# Altium footprint library Connectors.PcbLib: 87 footprints (part 1 of 6)
Each footprint in its own frame and in the unit in brackets; x right, y up, seen from the top. Pads: shape width x height; smd on the part's side, far side on the other; paste and mask are expansions set on the pad; w line width, h text height; cw(c..) or ccw(c..) is an arc to the next point about the centre after c.
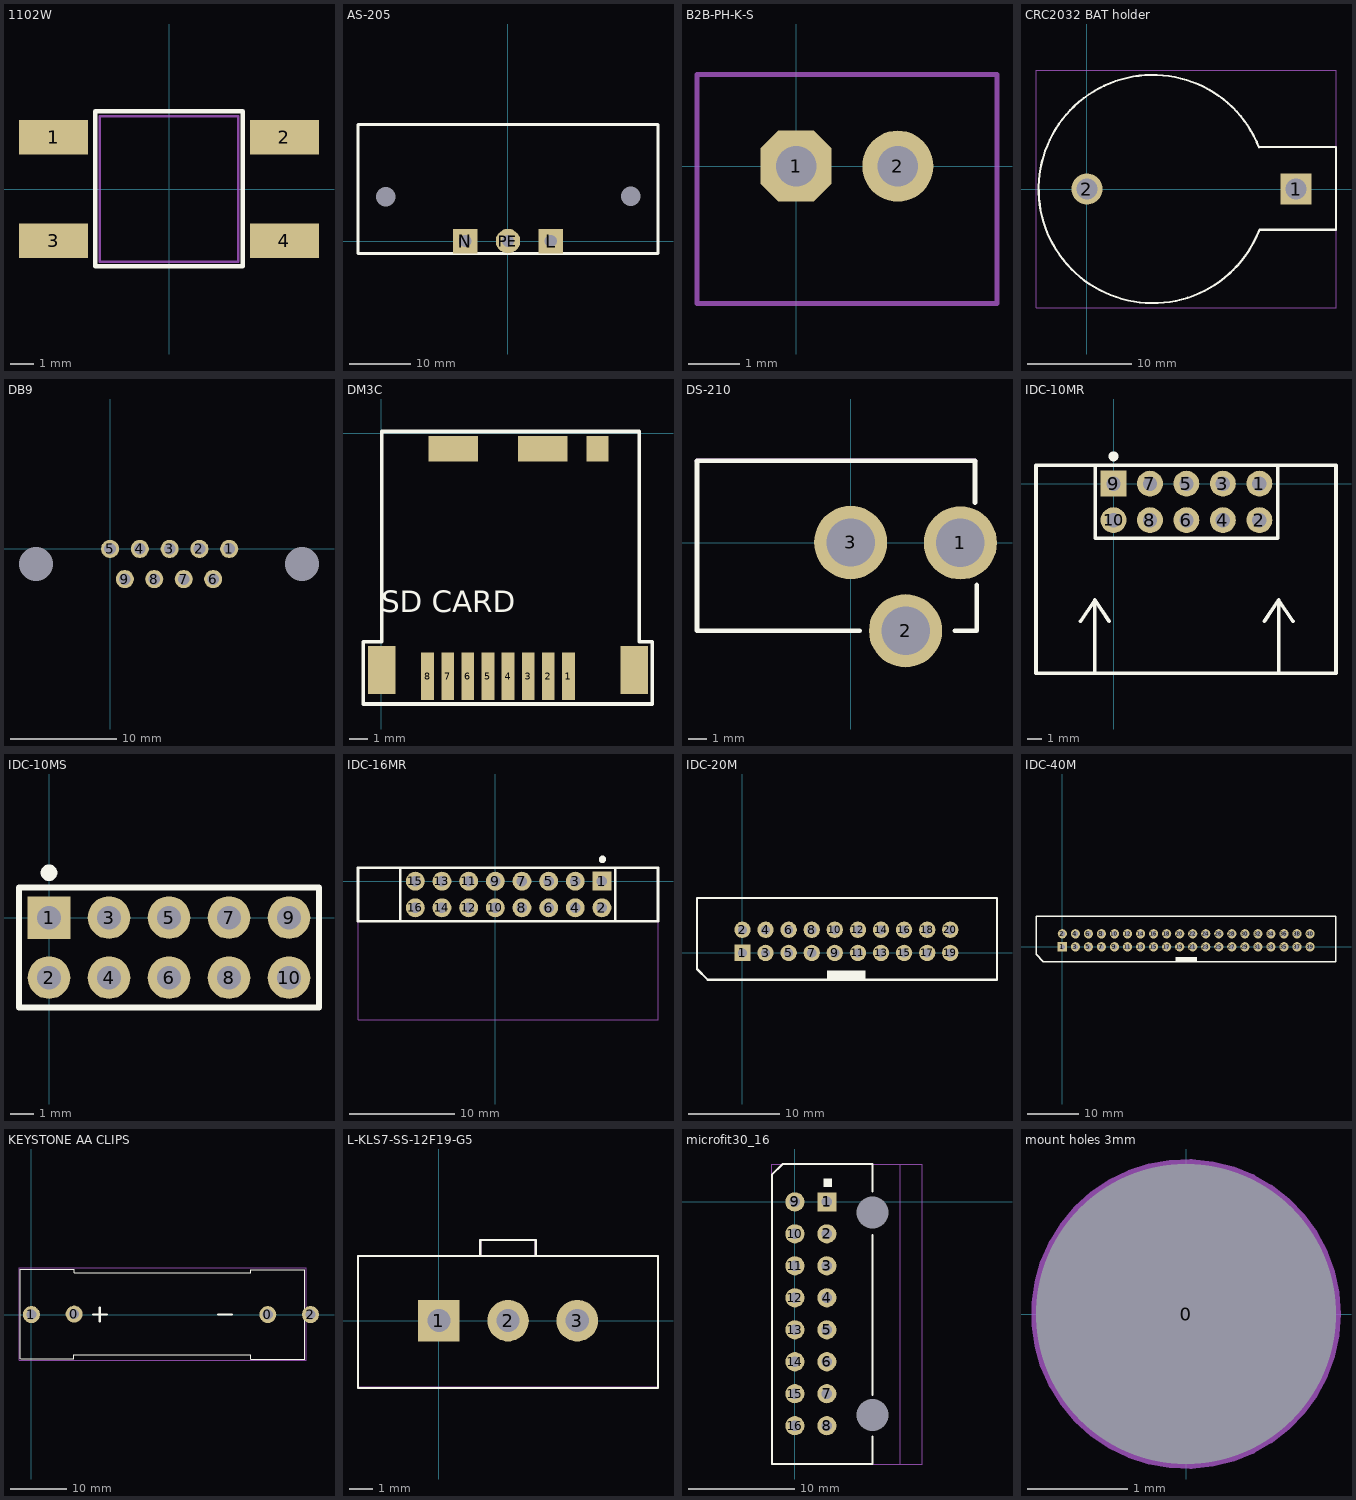
[diagram p0: the footprints below, top view; thin cyan lines are the x and y axes]

## 1102W [mm]
height 6
pads (4):
  rect 3x1.5 smd: 1(-5,2.25) 2(5,2.25) 3(-5,-2.25) 4(5,-2.25)
Top Overlay:
  lines w0.2: -3.2,-3.35 3.2,-3.35 3.2,3.375 -3.2,3.375 -3.2,-3.35
Mechanical 15:
  lines w0.1: -3,-3.15 3,-3.15 3,3.15 -3,3.15 -3,-3.15
3D body "TACT SMD 6X6.step": height 5, standoff 0, extent -5,-3 5,3

## AS-205 [mm]
height 30
pads (5):
  rect 4x4 hole 2: L(7,0) N(-7,0)
  round 0 hole 3.2 unplated mask+1.7: NPTH(-19.983,7.264) NPTH(20.022,7.289)
  round 4 hole 2: PE(0,0)
Top Overlay:
  lines w0.5: -24.5,-2 -24.5,19 24.5,19 24.5,-2 -24.5,-2
3D body "AS-205.STEP": height 26.8, standoff -3.8, extent -24.5,-2 24.5,19

## B2B-PH-K-S [mm]
pads (2):
  oct 1.4x1.4 hole 0.8: 1(0,0)
  round 1.4 hole 0.8: 2(2,0)
Mechanical 29:
  lines w0.1: -1.95,-2.7 3.95,-2.7 3.95,1.8 -1.95,1.8 -1.95,-2.7
  text ".Designator" at -1.1,-2 h1
3D body "User Library-JST B2B-PH-K-S.step": height 6, standoff -3.4, extent -1.95,-2.7 3.95,1.8

## CRC2032 BAT holder [mm]
pads (2):
  rect 3x3 hole 2: 1(20,0)
  round 3 hole 2: 2(0,0)
Top Overlay:
  lines w0.2: 16.466,3.987 ccw(c6.3,0) 16.5,-3.9 23.825,-3.9 23.825,4 16.5,4
Mechanical 29:
  lines w0.1: -4.875,-11.375 23.825,-11.375 23.825,11.375 -4.875,11.375 -4.875,-11.375
  text ".Designator" at 4.3,5.4 h1
3D body "CR 2032 Battery Holder.step": height 6.55, standoff -4, extent -4.875,-11.375 23.825,11.375

## DB9 [mm] "разьем COM232"
pads (11):
  round 1.7 hole 1.1: 1(11.2,0) 2(8.4,0) 3(5.6,0) 4(2.8,0) 5(0,0) 6(9.695,-2.84) 7(6.925,-2.84) 8(4.155,-2.84) 9(1.385,-2.84)
  round 0 hole 3.2 unplated mask+1.7: NPTH(-6.96,-1.42) NPTH(18.04,-1.42)
3D body "db9f-2.step": height 13.28, standoff -3.15, extent -9.791,-16.867 21.009,1.533

## DM3C [mm] "Держатель карты MicroSD на плату"
height 1
pads (13):
  rect 0.7x2.6 smd: 1(10.222,-13.288) 2(9.122,-13.288) 3(8.022,-13.288) 4(6.922,-13.288) 5(5.822,-13.288) 6(4.722,-13.288) 7(3.622,-13.288) 8(2.522,-13.288)
  rect 1.5x2.6 smd: ""(0.019,-12.942) ""(13.819,-12.942)
  rect 2.7x1.4 smd: ""(3.919,-0.842) ""(8.819,-0.842)
  rect 1.2x1.4 smd: ""(11.819,-0.842)
Top Overlay:
  lines w0.2: -1,-14.8 -1,-11.4 ; -0.983,-14.8 14.8,-14.8 14.8,-11.4 14.1,-11.4 14.1,0.1 0.019,0.1 0.019,-11.4 ; -0.983,-11.4 0,-11.4
  text "SD CARD" at 0,-10.16 h2
3D body "31785.stp": height 1.98, standoff 0.05, extent 0.3,-14.4 14.1,-0.3

## DS-210 [mm]
pads (3):
  round 4 hole 2.65: 1(6,0) 2(3,-4.8) 3(0,0.025)
Top Overlay:
  lines w0.254: 0.5,-4.8 -8.4,-4.8 -8.4,4.5 6.8,4.5 6.8,2.2 ; 5.7,-4.8 6.9,-4.8 6.9,-2.3
Mechanical 29:
  lines w0.25: -8.4,4.5 6.8,4.5
3D body "PowerJackFemale.STEP": height 11, standoff -3.5, extent -8.55,-4.756 6.75,4.6

## IDC-10MR [mm] "угловой разьем на плату"
pads (10):
  round 1.8 hole 1: 1(10.16,0) 2(10.16,-2.54) 3(7.62,0) 4(7.62,-2.54) 5(5.08,0) 6(5.08,-2.54) 7(2.54,0) 8(2.54,-2.54) 10(0,-2.54)
  rect 1.8x1.8 hole 1: 9(0,0)
Top Overlay:
  circle w0.5: c0,1.9 r0.1
  lines w0.254: -2.3,-9.6 -1.3,-8.1 ; -1.3,1.27 -5.4,1.27 -5.4,-13.2 15.5,-13.2 15.5,1.27 11.43,1.27 ; -1.2,-13.2 -1.3,-13.2 -1.3,-8.1 ; -0.3,-9.6 -1.3,-8.1 ; 10.5,-9.6 11.5,-8.1 ; 11.6,-13.2 11.5,-13.2 11.5,-8.1 ; 12.5,-9.6 11.5,-8.1 ; 11.43,1.27 -1.27,1.27 -1.27,-3.81 11.43,-3.81 11.43,1.27
3D body "IDC-10MR разьем.step": height 7.98, standoff -3.37, extent -5.435,-13.233 15.505,0.327

## IDC-10MS [mm]
pads (10):
  rect 1.8x1.8 hole 1: 1(0,0)
  round 1.8 hole 1: 2(0,-2.54) 3(2.54,0) 4(2.54,-2.54) 5(5.08,0) 6(5.08,-2.54) 7(7.62,0) 8(7.62,-2.54) 9(10.16,0) 10(10.16,-2.54)
Top Overlay:
  circle w0.5: c0,1.9 r0.1
  lines w0.254: -1.27,-3.81 -1.27,1.27 11.43,1.27 11.43,-3.81 -1.27,-3.81
3D body "IDC-10MS.STEP": height 9.45, standoff -3.25, extent -5.12,-6.202 15.28,3.148

## IDC-16MR [mm] "угловой разьем на плату"
pads (16):
  rect 1.8x1.8 hole 1: 1(10.16,0)
  round 1.8 hole 1: 2(10.16,-2.54) 3(7.62,0) 4(7.62,-2.54) 5(5.08,0) 6(5.08,-2.54) 7(2.54,0) 8(2.54,-2.54) 9(0,0) 10(0,-2.54) 11(-2.54,0) 12(-2.54,-2.54) 13(-5.08,0) 14(-5.08,-2.54) 15(-7.62,0) 16(-7.62,-2.54)
Top Overlay:
  lines w0.254: -1.3,1.27 -13.081,1.27 -13.081,-3.81 15.5,-3.81 15.5,1.27 11.43,1.27 ; 11.43,1.27 11.43,-3.81 -9.042,-3.81 -9.042,1.27 11.43,1.27
  lines w0.5: 10.311,2.083 cw(c10.211,2.083) 10.311,2.087
Mechanical 29:
  lines w0.1: -13.081,-13.2 15.5,-13.2 15.5,1.27 -13.081,1.27 -13.081,-13.2
  text ".Designator" at -3.5,-7 h1
3D body "User Library-IDC Socket Male 16pin Angled THT Goldplated 2_54mm.STEP": height 8.98, standoff -2.37, extent -13.01,-13.2 15.55,0.36

## IDC-20M [mm]
pads (20):
  rect 1.8x1.8 hole 1: 1(0,0)
  round 1.8 hole 1: 2(0,2.54) 3(2.54,0) 4(2.54,2.54) 5(5.08,0) 6(5.08,2.54) 7(7.62,0) 8(7.62,2.54) 9(10.16,0) 10(10.16,2.54) 11(12.7,0) 12(12.7,2.54) 13(15.24,0) 14(15.24,2.54) 15(17.78,0) 16(17.78,2.54) 17(20.32,0) 18(20.32,2.54) 19(22.86,0) 20(22.86,2.54)
Top Overlay:
  rectangle: 9.3,-2.98 13.55,-1.96
  lines w0.254: -5,-1.77 -3.81,-2.96 28,-2.96 28,6.04 -5,6.04 -5,-1.77
3D body "IDC-20M.step": height 9.63, standoff -2.77, extent -5.07,-2.98 27.93,5.87

## IDC-40M [mm] "угловой разьем на плату"
pads (40):
  rect 1.8x1.8 hole 1: 1(0,0)
  round 1.8 hole 1: 2(0,2.54) 3(2.54,0) 4(2.54,2.54) 5(5.08,0) 6(5.08,2.54) 7(7.62,0) 8(7.62,2.54) 9(10.16,0) 10(10.16,2.54) 11(12.7,0) 12(12.7,2.54) 13(15.24,0) 14(15.24,2.54) 15(17.78,0) 16(17.78,2.54) 17(20.32,0) 18(20.32,2.54) 19(22.86,0) 20(22.86,2.54) 21(25.4,0) 22(25.4,2.54) 23(27.94,0) 24(27.94,2.54) 25(30.48,0) 26(30.48,2.54) 27(33.02,0) 28(33.02,2.54) 29(35.56,0) 30(35.56,2.54) 31(38.1,0) 32(38.1,2.54) 33(40.64,0) 34(40.64,2.54) 35(43.18,0) 36(43.18,2.54) 37(45.72,0) 38(45.72,2.54) 39(48.26,0) 40(48.26,2.54)
Top Overlay:
  rectangle: 22,-2.826 26.25,-1.96
  lines w0.254: -5.131,-1.461 -3.722,-2.87 53.315,-2.87 53.315,5.918 -5.131,5.918 -5.131,-1.461
3D body "IDC-40M.step": height 9.63, standoff -2.77, extent -5.06,-2.977 53.34,5.873

## KEYSTONE AA CLIPS [mm]
pads (4):
  round 3 hole 1.8: 0(7.55,0.081) 0(41.8,0) 1(0,0) 2(49.35,0)
Top Overlay:
  lines w0.2: -1.964,-7.799 -1.964,8 7.6,8 7.6,7.4 38.8,7.4 38.8,7.9 48.3,7.9 48.3,-7.9 38.8,-7.9 38.8,-7.1 7.5,-7.1 7.5,-7.8 -1.9,-7.8
  lines w0.4: 10.9,0 13.3,0 ; 12.1,-1.2 12.1,1.2 ; 33,0 35.4,0
Mechanical 29:
  lines w0.1: -2.2,-8.1 48.6,-8.1 48.6,8.3 -2.2,8.3 -2.2,-8.1
  text ".Designator" at 18.8,0.7 h1.5
3D body "duracell ultra aa 1_5v mx 1500 lr6.step": height 17.25, standoff 2.75, extent -0.725,-7.101 49.525,7.4
3D body "AA batery clip keystone 2915 .step": height 16.69, standoff -4.02, extent -1.964,-7.799 7.55,7.961
3D body "AA batery clip keystone 2915 .step": height 16.69, standoff -4.02, extent 41.587,-7.88 51.1,7.88

## L-KLS7-SS-12F19-G5 [mm]
pads (3):
  rect 1.8x1.8 hole 1: 1(0,0)
  round 1.8 hole 1: 2(3,0) 3(6,0)
Top Overlay:
  lines w0.1: 1.8,2.8 1.8,3.5 4.2,3.5 4.2,2.8 ; -3.503,-2.921 9.497,-2.921 9.499,2.8 -3.501,2.8 -3.503,-2.921
Mechanical 29:
  lines w0.1: 1.8,2.8 1.8,3.5 4.2,3.5 4.2,2.8 ; -3.5,-2.9 9.499,-2.9 9.499,2.8 -3.5,2.8 -3.5,-2.9
  text ".Designator" at 0.5,2 h1
3D body "SK-12F14_G7.STEP": height 6.05, standoff -2.55, extent -3.503,-2.921 9.497,9.279

## microfit30_16 [mm]
pads (18):
  round 0 hole 3 unplated: 0(7.29,-19.99) 0(7.29,-1.016)
  rect 1.8x1.8 hole 1: 1(3,0)
  round 1.8 hole 1: 2(3,-3) 3(3,-6) 4(3,-9) 5(3,-12) 6(3,-15) 7(3,-18) 8(3,-21) 9(0,0) 10(0,-3) 11(0,-6) 12(0,-9) 13(0,-12) 14(0,-15) 15(0,-18) 16(0,-21)
Top Overlay:
  rectangle: 2.7,1.4 3.5,2.2
  lines w0.2: 7.29,-22.038 7.29,-24.594 -2.159,-24.594 -2.159,2.541 -1.144,3.556 7.29,3.556 7.29,1 ; 7.29,-18.1 7.29,-3.1
Mechanical 29:
  lines w0.1: 4.826,3.556 5.283,3.556 ; 5.283,-24.594 5.817,-24.594 ; 9.9,-24.594 9.9,3.556 ; -2.159,-24.594 11.937,-24.594 11.937,3.556 -2.159,3.556 -2.159,-24.594
  text ".Designator" at 5.1,-18.2 h1.5
3D body "430451600.stp": height 8.83, standoff -3.12, extent -0.29,-24.575 11.95,3.575

## mount holes 3mm [mil]
pads (1):
  round 60 hole 118.11 unplated: 0(0,0)
Mechanical 29:
  circle w3.94: c0,0 r59.06
Mechanical 30:
  circle w3.94: c0,0 r59.06